# Altium footprint library AltiumLibraries.PcbLib: 247 footprints (part 12 of 16)
Each footprint in its own frame and in the unit in brackets; x right, y up, seen from the top. Pads: shape width x height; smd on the part's side, far side on the other; paste and mask are expansions set on the pad; w line width, h text height; cw(c..) or ccw(c..) is an arc to the next point about the centre after c.
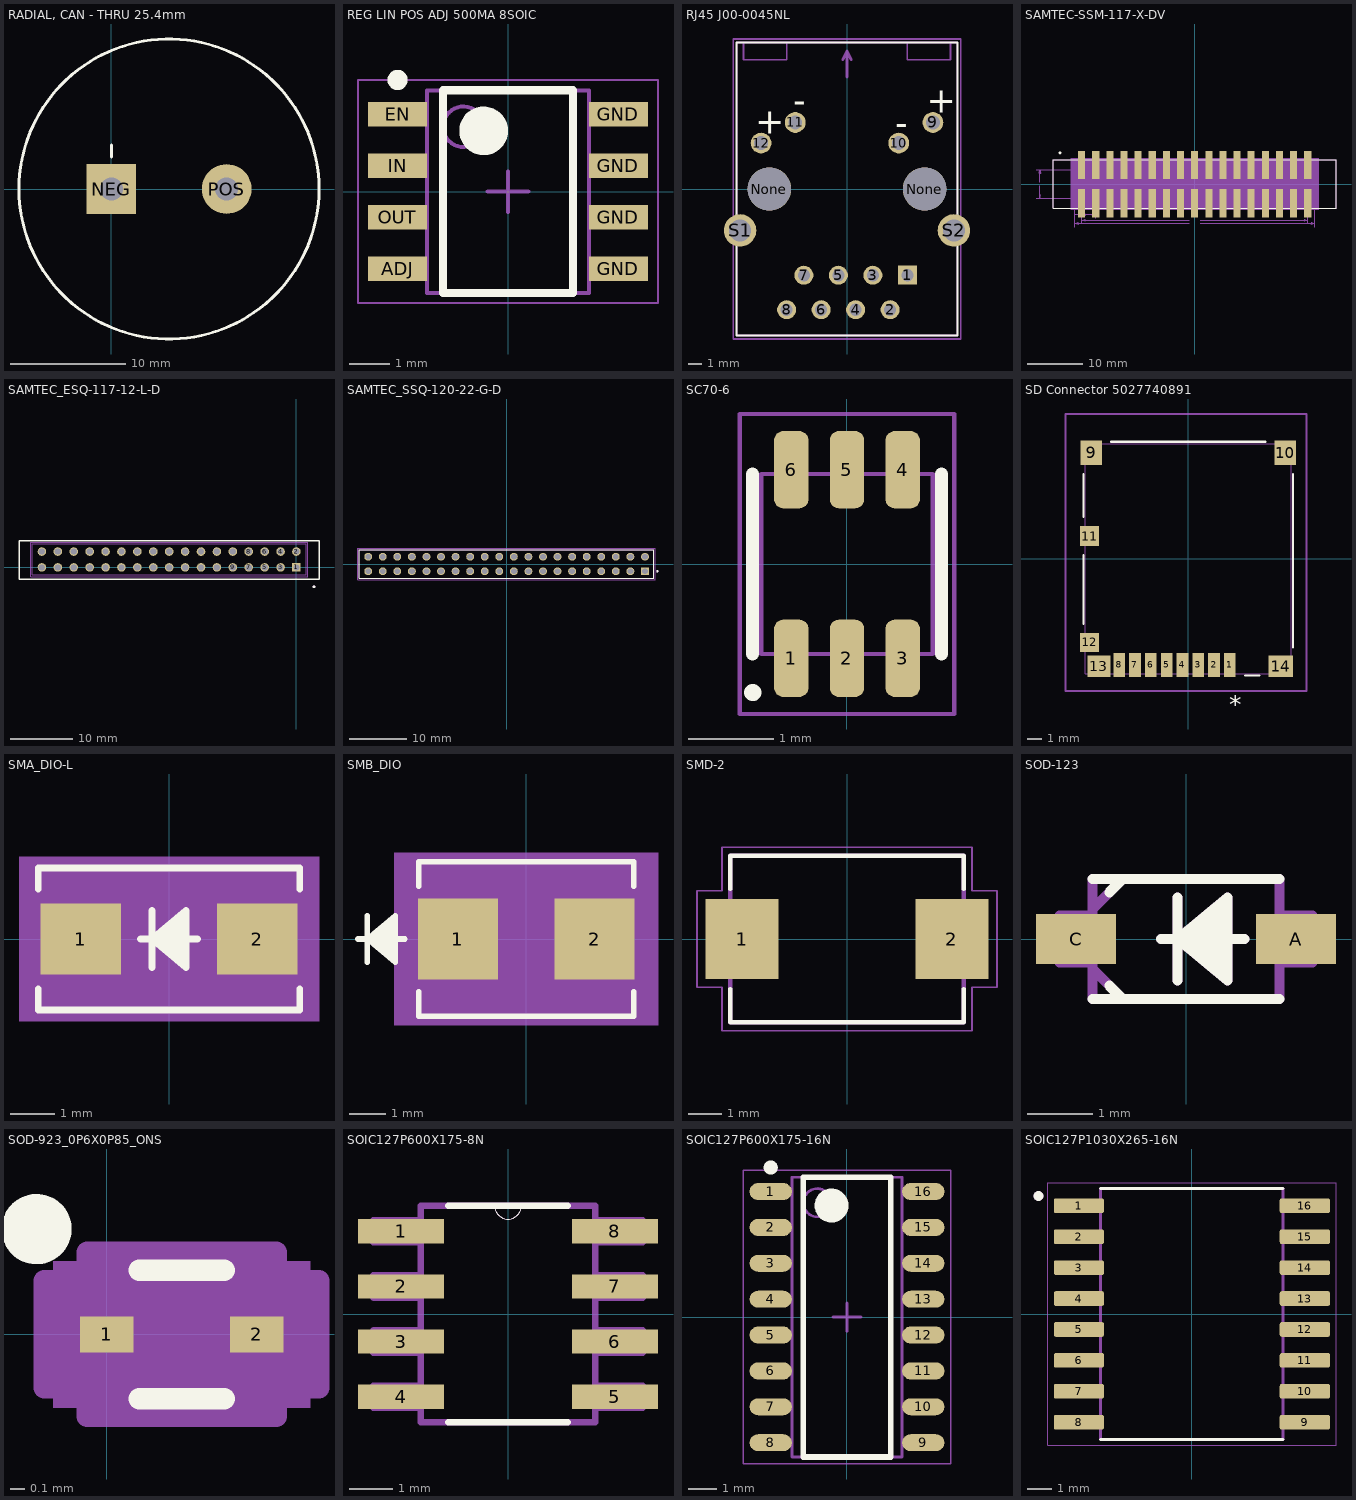
[diagram p11: the footprints below, top view; thin cyan lines are the x and y axes]

## RADIAL, CAN - THRU 25.4mm [mil]
pads (2):
  rect 170x170 hole 78.74: NEG(0,0)
  round 170 hole 78.74: POS(393.7,0)
Top Overlay:
  circle w10: c196.85,0 r511.81
  lines w10: 0,109.61 0,149.61
3D body: height 1771.65, standoff 0, extent -303.15,-500 696.85,500

## REG LIN POS ADJ 500MA 8SOIC [mm] "Linear Voltage Regulator IC  1 Output  500mA 8-SOIC"
height 1.75
pads (8):
  rect 1.45x0.6 smd: ADJ(-2.725,-1.905) EN(-2.725,1.905) GND(2.725,-1.905) GND(2.725,-0.635) GND(2.725,0.635) GND(2.725,1.905) IN(-2.725,0.635) OUT(-2.725,-0.635)
Top Overlay:
  circle w0.6: c-0.6,1.5 r0.3
  circle w0.25: c-2.725,2.755 r0.125
  lines w0.2: -1.6,-2.5 1.6,-2.5 1.6,2.5 -1.6,2.5 -1.6,-2.5
Mechanical 13:
  circle w0.1: c-1.1,1.6 r0.5
  lines w0.1: -2,-2.5 2,-2.5 2,2.5 -2,2.5 -2,-2.5
Mechanical 15:
  lines w0.05: -3.7,-2.75 3.7,-2.75 3.7,2.75 -3.7,2.75 -3.7,-2.75
  lines w0.1: -0.5,0 0.5,0 ; 0,-0.5 0,0.5
3D body: height 1.75, standoff 0.1, extent -2,-2.5 2,2.5

## RJ45 J00-0045NL [mm]
pads (16):
  rect 1.398x1.398 hole 0.89: 1(4.445,-6.35)
  round 1.398 hole 0.89: 2(3.175,-8.89) 3(1.905,-6.35) 4(0.635,-8.89) 5(-0.635,-6.35) 6(-1.905,-8.89) 7(-3.175,-6.35) 8(-4.445,-8.89)
  round 1.53 hole 1.02: 9(6.325,4.9) 10(3.81,3.38) 11(-3.81,4.9) 12(-6.325,3.38)
  round 3.2 hole 3.2 unplated: None(-5.715,0) None(5.715,0)
  round 2.4 hole 1.6: S1(-7.875,-3.05) S2(7.875,-3.05)
Top Overlay:
  lines w0.127: -8.13,-10.795 -8.13,10.795 8.13,10.795 8.13,-10.795 -8.13,-10.795
  text "+" at -6.749,4.077 h1.88
  text "-" at -3.947,5.606 h1.88
  text "-" at 3.569,3.949 h1.88
  text "+" at 5.865,5.604 h1.88
Mechanical 4:
  lines w0.127: -8.128,-10.795 8.128,-10.795 ; -8.128,-10.795 -8.128,10.795 ; -8.128,-10.795 8.128,-10.795 ; -8.128,-10.795 -8.128,10.795 ; -8.128,10.795 8.128,10.795 ; -8.128,10.795 8.128,10.795 ; -7.62,9.525 -4.445,9.525 ; -7.62,9.525 -7.62,10.795 -7.62,9.525 ; -7.62,9.525 -4.445,9.525 ; -4.445,9.525 -4.445,10.795 -4.445,9.525 ; 4.445,9.525 7.62,9.525 ; 4.445,9.525 4.445,10.795 4.445,9.525 ; 4.445,9.525 7.62,9.525 ; 7.62,9.525 7.62,10.795 7.62,9.525 ; 8.128,-10.795 8.128,10.795 ; 8.128,-10.795 8.128,10.795
  lines w0.203: 0,10.16 0.318,9.525 0,10.16 ; 0,10.16 -0.318,9.525 0,10.16 ; 0,10.16 0,8.255 0,10.16
  text "12" at -7.753,1.402 h1.88
  text "11" at -4.327,2.805 h1.88
  text "10" at 2.804,1.152 h1.88
  text "9" at 6.235,2.804 h1.88
  text "FRONT" at -1.592,6.436 h1.88
  text "RIGHT" at -7.327,9.625 h1.88
  text "LEFT" at 5.102,9.636 h1.88
  text "2" at 3.823,-8.534 h1.88
  text "4" at 1.273,-8.524 h1.88
  text "6" at -1.277,-8.553 h1.88
  text "8" at -3.827,-8.542 h1.88
  text "7" at -2.549,-5.984 h1.88
  text "5" at 0,-5.995 h1.88
  text "3" at 2.547,-5.981 h1.88
  text "1" at 5.105,-5.993 h1.88
  text "12" at -7.753,1.402 h1.88
  text "11" at -4.327,2.805 h1.88
  text "10" at 2.804,1.152 h1.88
  text "9" at 6.235,2.804 h1.88
  text "FRONT" at -1.592,6.436 h1.88
  text "RIGHT" at -7.327,9.625 h1.88
  text "LEFT" at 5.102,9.636 h1.88
  text "2" at 3.823,-8.534 h1.88
  text "4" at 1.273,-8.524 h1.88
  text "6" at -1.277,-8.553 h1.88
  text "8" at -3.827,-8.542 h1.88
  text "7" at -2.549,-5.984 h1.88
  text "5" at 0,-5.995 h1.88
  text "3" at 2.547,-5.981 h1.88
  text "1" at 5.105,-5.993 h1.88
Mechanical 15:
  lines w0.127: -8.378,-11.045 -8.378,11.045 8.378,11.045 8.378,-11.045 -8.378,-11.045
3D body "J00-0045NL_3D.STEP": height 13.64, standoff -3.5, extent -8.115,-10.785 8.115,10.797

## SAMTEC-SSM-117-X-DV [mil]
pads (34):
  rect 50x200 smd: 1(-800,135) 2(-800,-135) 3(-700,135) 4(-700,-135) 5(-600,135) 6(-600,-135) 7(-500,135) 8(-500,-135) 9(-400,135) 10(-400,-135) 11(-300,135) 12(-300,-135) 13(-200,135) 14(-200,-135) 15(-100,135) 16(-100,-135) 17(0,135) 18(0,-135) 19(100,135) 20(100,-135) 21(200,135) 22(200,-135) 23(300,135) 24(300,-135) 25(400,135) 26(400,-135) 27(500,135) 28(500,-135) 29(600,135) 30(600,-135) 31(700,135) 32(700,-135) 33(800,135) 34(800,-135)
Top Overlay:
  circle w10: c-952.76,220.47 r4.72
  lines w7.87: -1000,-172.72 1000,-172.72 1000,172.72 -1000,172.72 -1000,-172.72
Mechanical 13:
  drawing of 462 lines, arcs and shapes, not listed
  text "2.540" at -903.5,-220 h10
  text "5.080" at -1120.98,-5 h10
  text "43.180" at -31.5,-282.52 h10
  text "40.640" at -31.5,-260 h10
Mechanical 15:
  region: 876.97,-181.97 -876.97,-181.97 -876.97,181.97 876.97,181.97
3D body "2530-6V0C-XX_STEP.stp": height 399.53, standoff -0.47, extent -994,-220.78 994,219.22

## SAMTEC_ESQ-117-12-L-D [mm]
pads (34):
  rect 1.37x1.37 hole 1.02: 1(0,0)
  round 1.37 hole 1.02: 2(0,2.54) 3(-2.54,0) 4(-2.54,2.54) 5(-5.08,0) 6(-5.08,2.54) 7(-7.62,0) 8(-7.62,2.54) 9(-10.16,0) 10(-10.16,2.54) 11(-12.7,0) 12(-12.7,2.54) 13(-15.24,0) 14(-15.24,2.54) 15(-17.78,0) 16(-17.78,2.54) 17(-20.32,0) 18(-20.32,2.54) 19(-22.86,0) 20(-22.86,2.54) 21(-25.4,0) 22(-25.4,2.54) 23(-27.94,0) 24(-27.94,2.54) 25(-30.48,0) 26(-30.48,2.54) 27(-33.02,0) 28(-33.02,2.54) 29(-35.56,0) 30(-35.56,2.54) 31(-38.1,0) 32(-38.1,2.54) 33(-40.64,0) 34(-40.64,2.54)
Top Overlay:
  circle w0.2: c2.8,-3.1 r0.1
  lines w0.2: -44.3,-1.9 3.6,-1.9 3.6,4.3 -44.3,4.3 -44.3,-1.9
Mechanical 13:
  circle w0.2: c2.8,-3.1 r0.1
  lines w0.1: -42.165,-1.205 -42.165,3.745 ; -42.165,-1.205 1.525,-1.205 ; -42.165,-1.205 -42.165,3.745 ; -42.165,3.745 1.525,3.745 ; -42.165,3.745 1.525,3.745 ; 1.525,-1.205 1.525,3.745 ; 1.525,-1.205 1.525,3.745
Mechanical 15:
  lines w0.05: -42.415,-1.455 1.775,-1.455 1.775,3.995 -42.415,3.995 -42.415,-1.455
3D body "HIF3FB-34DA-2.54DSA.stp": height 9.5, standoff -3, extent -44.205,-2.95 3.545,4.25

## SAMTEC_SSQ-120-22-G-D [mm]
pads (40):
  rect 1.37x1.37 hole 1.02: 01(24.13,-1.27)
  round 1.37 hole 1.02: 02(24.13,1.27) 03(21.59,-1.27) 04(21.59,1.27) 05(19.05,-1.27) 06(19.05,1.27) 07(16.51,-1.27) 08(16.51,1.27) 09(13.97,-1.27) 10(13.97,1.27) 11(11.43,-1.27) 12(11.43,1.27) 13(8.89,-1.27) 14(8.89,1.27) 15(6.35,-1.27) 16(6.35,1.27) 17(3.81,-1.27) 18(3.81,1.27) 19(1.27,-1.27) 20(1.27,1.27) 21(-1.27,-1.27) 22(-1.27,1.27) 23(-3.81,-1.27) 24(-3.81,1.27) 25(-6.35,-1.27) 26(-6.35,1.27) 27(-8.89,-1.27) 28(-8.89,1.27) 29(-11.43,-1.27) 30(-11.43,1.27) 31(-13.97,-1.27) 32(-13.97,1.27) 33(-16.51,-1.27) 34(-16.51,1.27) 35(-19.05,-1.27) 36(-19.05,1.27) 37(-21.59,-1.27) 38(-21.59,1.27) 39(-24.13,-1.27) 40(-24.13,1.27)
Top Overlay:
  circle w0.2: c26.305,-1.27 r0.1
  lines w0.2: -25.655,-2.475 25.655,-2.475 25.655,2.475 -25.655,2.475 -25.655,-2.475
Mechanical 13:
  circle w0.2: c26.305,-1.27 r0.1
  lines w0.1: -25.655,-2.475 -25.655,2.475 ; -25.655,-2.475 25.655,-2.475 ; -25.655,-2.475 -25.655,2.475 ; -25.655,2.475 25.655,2.475 ; -25.655,2.475 25.655,2.475 ; 25.655,-2.475 25.655,2.475 ; 25.655,-2.475 25.655,2.475
Mechanical 15:
  lines w0.05: -25.905,-2.725 25.905,-2.725 25.905,2.725 -25.905,2.725 -25.905,-2.725
3D body "40Pin.STEP": height 11.06, standoff -6.99, extent -25.7,-2.525 25.7,2.475

## SC70-6 [mm] "Current Sense Amp Footprint"
pads (6):
  rrect50% 0.4x0.9 smd mask+0.075: 1(-0.65,-1.1) 2(0,-1.1) 3(0.65,-1.1) 4(0.65,1.1) 5(0,1.1) 6(-0.65,1.1)
Top Overlay:
  circle w0.2: c-1.1,-1.5 r0.001
  lines w0.152: -1.1,-1.05 -1.1,1.05 ; 1.1,-1.05 1.1,1.05
Mechanical 13:
  lines w0.05: -1,-1.05 1,-1.05 1,1.05 -1,1.05 -1,-1.05
Mechanical 15:
  lines w0.05: -1.25,-1.75 1.25,-1.75 1.25,1.75 -1.25,1.75 -1.25,-1.75
3D body "DCK0006A.stp": height 1, standoff 0, extent -1,-1.05 1,1.05

## SD Connector 5027740891 [mil]
height 70.87
pads (14):
  rect 32x66 smd paste+0 mask+0: 1(114.13,-290.83) 2(70.83,-290.83) 3(27.52,-290.83) 4(-15.79,-290.83) 5(-59.09,-290.83) 6(-102.4,-290.83) 7(-145.71,-290.83) 8(-189.02,-290.83)
  rect 59x67 smd: 9(-265.77,290.33) 10(265.77,290.33)
  rect 51x55 smd paste+0 mask+0: 11(-270.04,62.09)
  rect 51x51 smd: 12(-270.04,-229.25)
  rect 63x59 smd: 13(-244.14,-294.33)
  rect 67x59 smd: 14(253.92,-294.33)
Top Overlay:
  lines w6: -286.5,-178 -286.5,10 ; -286.5,114.83 -286.5,231.83 ; -211.27,320 211.27,320 ; 155.13,-320 195.53,-320 ; 286.5,-243.07 286.5,231.83
  text "*" at 112.5,-425 h50
Mechanical 13:
  lines w1: -281.5,-315 -281.5,315 281.5,315 281.5,-315 -281.5,-315
  text "*" at 164,-425 h50
Mechanical 15:
  lines w6: -336,-362 -336,396 324,396 324,-362 -336,-362
3D body: height 10, standoff 0, extent 0,0 10,10
3D body "5027740891.stp": height -12.99, standoff -83.86, extent -279.85,-312.04 283.15,317.88

## SMA_DIO-L [mm]
pads (2):
  rect 1.799x1.579 smd paste+0 mask+0: 1(-1.971,0) 2(1.971,0)
Top Overlay:
  lines w0.152: -2.922,-1.118 -2.922,-1.587 2.922,-1.587 2.922,-1.118 ; -2.922,1.118 -2.922,1.587 2.922,1.587 2.922,1.118 ; -0.636,0 0.634,0 ; -0.382,-0.635 -0.382,0.635 ; 0.38,-0.508 -0.382,0 ; 0.38,-0.381 -0.382,0 ; 0.38,-0.254 -0.382,0 ; 0.38,-0.127 -0.382,0 ; 0.38,0.127 -0.382,0 ; 0.38,0.254 -0.382,0 ; 0.38,0.381 -0.382,0 ; 0.38,0.508 -0.382,0 ; -0.382,0 0.38,0.635 0.38,-0.635 -0.382,0
Mechanical 5:
  region: 3.354,-1.841 -3.354,-1.841 -3.354,1.841 3.354,1.841
Mechanical 13:
  lines w0.025: -0.636,0 0.634,0 ; -0.382,-0.635 -0.382,0.635 ; 0.38,-0.508 -0.382,0 ; 0.38,-0.381 -0.382,0 ; 0.38,-0.254 -0.382,0 ; 0.38,-0.127 -0.382,0 ; 0.38,0.127 -0.382,0 ; 0.38,0.254 -0.382,0 ; 0.38,0.381 -0.382,0 ; 0.38,0.508 -0.382,0 ; -0.382,0 0.38,0.635 0.38,-0.635 -0.382,0 ; -2.795,-1.46 2.795,-1.46 2.795,1.46 -2.795,1.46 -2.795,-1.46
Mechanical 15:
  region: -2.897,-0.917 -2.973,-0.917 -2.973,0.917 -2.897,0.917 -2.897,1.562 2.897,1.562 2.897,0.917 2.973,0.917 2.973,-0.917 2.897,-0.917 2.897,-1.562 -2.897,-1.562
  lines w0.152: -2.973,-0.917 -2.973,0.917 -2.897,0.917 -2.897,1.562 2.897,1.562 2.897,0.917 2.973,0.917 2.973,-0.917 2.897,-0.917 2.897,-1.562 -2.897,-1.562 -2.897,-0.917 -2.973,-0.917
3D body "SMA_DIO.step": height 2.35, standoff 0, extent -2.795,-1.46 2.795,1.46

## SMB_DIO [mm]
pads (2):
  rect 2.18x2.21 smd paste+0 mask+0: 1(-1.857,0) 2(1.857,0)
Top Overlay:
  lines w0.152: -4.573,0 -3.303,0 ; -4.319,-0.635 -4.319,0.635 ; -3.557,-0.508 -4.319,0 ; -3.557,-0.381 -4.319,0 ; -3.557,-0.254 -4.319,0 ; -3.557,-0.127 -4.319,0 ; -3.557,0.127 -4.319,0 ; -3.557,0.254 -4.319,0 ; -3.557,0.381 -4.319,0 ; -3.557,0.508 -4.319,0 ; -2.922,-1.438 -2.922,-2.097 2.922,-2.097 2.922,-1.438 ; -2.922,1.438 -2.922,2.097 2.922,2.097 2.922,1.438 ; -4.319,0 -3.557,-0.635 -3.557,0.635 -4.319,0
Mechanical 5:
  region: 3.582,-2.351 -3.582,-2.351 -3.582,2.351 3.582,2.351
Mechanical 13:
  lines w0.025: -4.573,0 -3.303,0 ; -4.319,-0.635 -4.319,0.635 ; -3.557,-0.508 -4.319,0 ; -3.557,-0.381 -4.319,0 ; -3.557,-0.254 -4.319,0 ; -3.557,-0.127 -4.319,0 ; -3.557,0.127 -4.319,0 ; -3.557,0.254 -4.319,0 ; -3.557,0.381 -4.319,0 ; -3.557,0.508 -4.319,0 ; -4.319,0 -3.557,-0.635 -3.557,0.635 -4.319,0 ; -2.795,-1.97 -2.795,1.97 2.795,1.97 2.795,-1.97 -2.795,-1.97
Mechanical 15:
  region: -3.049,-1.359 -3.201,-1.359 -3.201,1.359 -3.049,1.359 -3.049,2.224 3.049,2.224 3.049,1.359 3.201,1.359 3.201,-1.359 3.049,-1.359 3.049,-2.224 -3.049,-2.224
  lines w0.152: -3.201,-1.359 -3.049,-1.359 -3.049,-2.224 3.049,-2.224 3.049,-1.359 3.201,-1.359 3.201,1.359 3.049,1.359 3.049,2.224 -3.049,2.224 -3.049,1.359 -3.201,1.359 -3.201,-1.359
3D body "SMB_DIO.step": height 2.45, standoff 0, extent -2.795,-1.97 2.795,1.97

## SMD-2 [mm]
pads (2):
  rect 2.2x2.4 smd: 1(-3.15,0) 2(3.15,0)
Top Overlay:
  lines w0.127: -3.5,-1.5 -3.5,-2.5 3.5,-2.5 3.5,-1.5 ; -3.5,1.5 -3.5,2.5 3.5,2.5 3.5,1.5
Mechanical 4:
  lines w0.127: -3.5,-2.5 -3.5,2.5 ; -3.5,-2.5 3.5,-2.5 ; -3.5,-2.5 -3.5,2.5 ; -3.5,-2.5 3.5,-2.5 ; -3.5,2.5 3.5,2.5 ; -3.5,2.5 3.5,2.5 ; 3.5,-2.5 3.5,2.5 ; 3.5,-2.5 3.5,2.5
Mechanical 15:
  lines w0.05: -4.5,-1.45 -4.5,1.45 -3.75,1.45 -3.75,2.75 3.75,2.75 3.75,1.45 4.5,1.45 4.5,-1.45 3.75,-1.45 3.75,-2.75 -3.75,-2.75 -3.75,-1.45 -4.5,-1.45

## SOD-123 [mil]
pads (2):
  rect 48x30 smd: A(66,0) C(-66,0)
Top Overlay:
  lines w6: -56,-36 -38,-36 ; -56,36 -38,36 ; -46,-28 -38,-36 ; -46,28 -38,36 ; -15,0 -5,0 ; -5,-25 -5,0 ; -5,25 -5,0 ; 35,0 -5,0 ; 56,-36 -38,-36 ; 56,36 -38,36 ; -5,0 25,25 25,20 ; -5,0 25,20 ; -5,0 25,15 ; -5,0 25,10 ; -5,0 25,5 ; -5,0 25,-25 25,-20 ; -5,0 25,-20 ; -5,0 25,-15 ; -5,0 25,-10 ; -5,0 25,-5 ; 25,-20 25,-15 ; 25,-15 25,-10 ; 25,-10 25,-5 ; 25,-5 25,5 ; 25,5 25,10 ; 25,10 25,15 ; 25,15 25,20
Mechanical 4:
  lines w6: -76,-14 -76,14 ; -76,-14 -56,-14 ; -76,-14 -76,14 ; -76,-14 -56,-14 ; -76,14 -56,14 ; -76,14 -56,14 ; -56,-36 -56,-18 ; -56,-36 -38,-36 ; -56,-36 -56,-18 ; -56,-36 -38,-36 ; -56,-18 -56,-14 ; -56,-18 -38,-36 ; -56,-18 -56,-14 ; -56,-18 -38,-36 ; -56,-14 -56,14 ; -56,-14 -56,14 ; -56,14 -56,18 ; -56,14 -56,18 ; -56,18 -56,36 ; -56,18 -38,36 ; -56,18 -56,36 ; -56,18 -38,36 ; -56,36 -38,36 ; -56,36 -38,36 ; -38,-36 56,-36 ; -38,-36 56,-36 ; -38,36 56,36 ; -38,36 56,36 ; -5,0 -15,0 -5,0 ; -5,0 -5,-25 -5,0 ; -5,0 35,0 -5,0 ; -5,0 -5,25 -5,0 ; -5,0 25,25 ; -5,0 25,20 ; -5,0 25,15 ; -5,0 25,10 ; -5,0 25,5 ; -5,0 25,-25 ; -5,0 25,-20 ; -5,0 25,-15 ; -5,0 25,-10 ; -5,0 25,-5 ; -5,0 25,25 ; -5,0 25,20 ; -5,0 25,15 ; -5,0 25,10 ; -5,0 25,5 ; -5,0 25,-25 ; -5,0 25,-20 ; -5,0 25,-15 ; -5,0 25,-10 ; -5,0 25,-5 ; 25,-25 25,-20 ; 25,-25 25,-20 ; 25,-20 25,-15 ; 25,-20 25,-15 ; 25,-15 25,-10 ; 25,-15 25,-10 ; 25,-10 25,-5 ; 25,-10 25,-5 ; 25,-5 25,5 ; 25,-5 25,5 ; 25,5 25,10 ; 25,5 25,10 ; 25,10 25,15 ; 25,10 25,15 ; 25,15 25,20 ; 25,15 25,20 ; 25,20 25,25 ; 25,20 25,25 ; 56,-36 56,-14 ; 56,-36 56,-14 ; 56,-14 76,-14 ; 56,-14 56,14 ; 56,-14 76,-14 ; 56,-14 56,14 ; 56,14 56,36 ; 56,14 76,14 ; 56,14 56,36 ; 56,14 76,14 ; 76,-14 76,14 ; 76,-14 76,14
3D body "sod123 v4.step": height 47.24, standoff 0, extent -73.82,-33.46 73.82,33.46

## SOD-923_0P6X0P85_ONS [mil]
pads (2):
  rect 15x10 smd paste+0 mask+0: 1(0,0) 2(42,0)
Top Overlay:
  circle w9.84: c-19.68,29.53 r4.92
  lines w6: 9.12,-18 32.88,-18 ; 9.12,18 32.88,18
Mechanical 5:
  region: 57,-20.5 -15,-20.5 -15,20.5 57,20.5
Mechanical 13:
  lines w1: 4.5,-6.5 11,-13 ; 4.5,6.5 11,13 ; 0.5,-5 4.5,-5 4.5,5 0.5,5 0.5,-5 ; 4.5,-13 4.5,13 37.5,13 37.5,-13 4.5,-13 ; 37.5,-5 41.5,-5 41.5,5 37.5,5 37.5,-5
  text "*" at 2,-25 h50
Mechanical 15:
  region: -5.5,-15 -17.5,-15 -17.5,15 -5.5,15 -5.5,23 47.5,23 47.5,15 59.5,15 59.5,-15 47.5,-15 47.5,-23 -5.5,-23
  lines w6: -17.5,-15 -5.5,-15 -5.5,-23 47.5,-23 47.5,-15 59.5,-15 59.5,15 47.5,15 47.5,23 -5.5,23 -5.5,15 -17.5,15 -17.5,-15
3D body "SOD-923_0P6X0P85_ONS.step": height 9.21, standoff 0, extent 1.14,-13.78 42.17,13.31

## SOIC127P600X175-8N [mil]
pads (8):
  rect 78x22 smd: 1(-97,75) 2(-97,25) 3(-97,-25) 4(-97,-75) 5(97,-75) 6(97,-25) 7(97,25) 8(97,75)
Top Overlay:
  lines w0: -12,98 ccw(c0,98) 12,98
  lines w6: -54,-98 54,-98 ; -54,98 -12,98 12,98 54,98
Mechanical 13:
  lines w0: -12,98 ccw(c0,98) 12,98
  lines w6: -122,-85 -79,-85 -79,-65 -122,-65 -122,-85 ; -122,-35 -79,-35 -79,-15 -122,-15 -122,-35 ; -122,15 -79,15 -79,35 -122,35 -122,15 ; -122,65 -79,65 -79,85 -122,85 -122,65 ; -79,-98 -79,98 -12,98 12,98 79,98 79,-98 -79,-98 ; 79,-85 122,-85 122,-65 79,-65 79,-85 ; 79,-35 122,-35 122,-15 79,-15 79,-35 ; 79,15 122,15 122,35 79,35 79,15 ; 79,65 122,65 122,85 79,85 79,65
3D body "step_temp.STEP": height 68.66, standoff -0.23, extent -118.11,-96.45 118.11,96.46

## SOIC127P600X175-16N [mm] "SOIC, 16-Leads, Body 9.90x3.90mm, Pitch 1.27mm, IPC Medium Density"
height 1.75
pads (16):
  oval 1.5x0.6 smd: 1(-2.7,4.445) 2(-2.7,3.175) 3(-2.7,1.905) 4(-2.7,0.635) 5(-2.7,-0.635) 6(-2.7,-1.905) 7(-2.7,-3.175) 8(-2.7,-4.445) 9(2.7,-4.445) 10(2.7,-3.175) 11(2.7,-1.905) 12(2.7,-0.635) 13(2.7,0.635) 14(2.7,1.905) 15(2.7,3.175) 16(2.7,4.445)
Top Overlay:
  circle w0.6: c-0.55,3.95 r0.3
  circle w0.25: c-2.7,5.295 r0.125
  lines w0.2: -1.55,-4.95 1.55,-4.95 1.55,4.95 -1.55,4.95 -1.55,-4.95
Mechanical 13:
  circle w0.1: c-1.05,4.05 r0.5
  lines w0.1: -1.95,-4.95 1.95,-4.95 1.95,4.95 -1.95,4.95 -1.95,-4.95
Mechanical 15:
  lines w0.05: -3.675,-5.2 3.675,-5.2 3.675,5.2 -3.675,5.2 -3.675,-5.2
  lines w0.1: -0.5,0 0.5,0 ; 0,-0.5 0,0.5
3D body: height 1.75, standoff 0.1, extent -1.95,-4.95 1.95,4.95

## SOIC127P1030X265-16N [mm]
pads (16):
  rrect25% 2.06x0.6 smd: 1(-4.64,4.445) 2(-4.64,3.175) 3(-4.64,1.905) 4(-4.64,0.635) 5(-4.64,-0.635) 6(-4.64,-1.905) 7(-4.64,-3.175) 8(-4.64,-4.445) 9(4.64,-4.445) 10(4.64,-3.175) 11(4.64,-1.905) 12(4.64,-0.635) 13(4.64,0.635) 14(4.64,1.905) 15(4.64,3.175) 16(4.64,4.445)
Top Overlay:
  circle w0.2: c-6.3,4.845 r0.1
  lines w0.127: -3.75,-5.15 3.75,-5.15 ; -3.75,5.15 3.75,5.15
Mechanical 13:
  circle w0.2: c-6.3,4.845 r0.1
  lines w0.127: -3.75,-5.15 3.75,-5.15 3.75,5.15 -3.75,5.15 -3.75,-5.15
Mechanical 15:
  lines w0.05: -5.92,-5.4 5.92,-5.4 5.92,5.4 -5.92,5.4 -5.92,-5.4